# Altium footprint library SparkFun.PCBLIB: 674 footprints (part 31 of 44)
Each footprint in its own frame and in the unit in brackets; x right, y up, seen from the top. Pads: shape width x height; smd on the part's side, far side on the other; paste and mask are expansions set on the pad; w line width, h text height; cw(c..) or ccw(c..) is an arc to the next point about the centre after c.
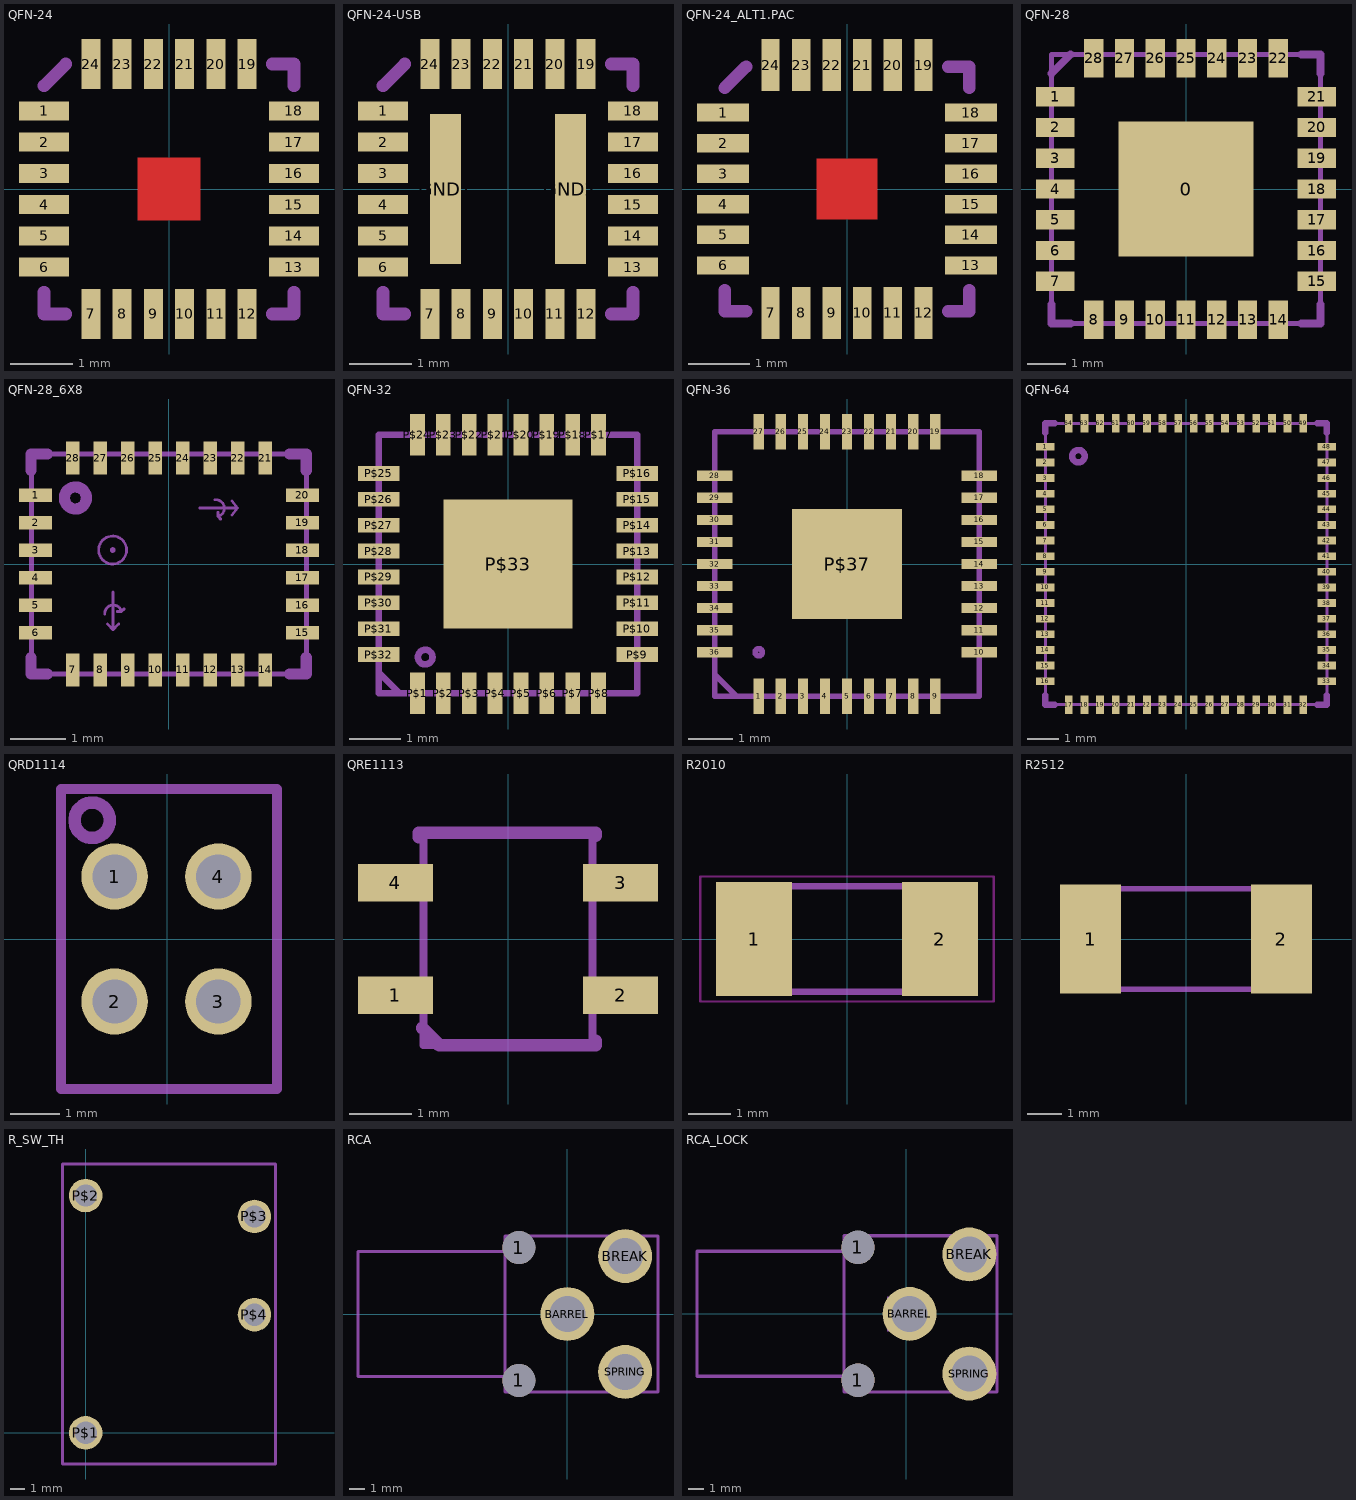
[diagram p30: the footprints below, top view; thin cyan lines are the x and y axes]

## QFN-24 [mil]
pads (24):
  rect 31.5x11.81 smd: 1(-78.74,49.21) 2(-78.74,29.53) 3(-78.74,9.84) 4(-78.74,-9.84) 5(-78.74,-29.53) 6(-78.74,-49.21) 13(78.74,-49.21) 14(78.74,-29.53) 15(78.74,-9.84) 16(78.74,9.84) 17(78.74,29.53) 18(78.74,49.21)
  rect 11.81x31.5 smd: 7(-49.21,-78.74) 8(-29.53,-78.74) 9(-9.84,-78.74) 10(9.84,-78.74) 11(29.53,-78.74) 12(49.21,-78.74) 19(49.21,78.74) 20(29.53,78.74) 21(9.84,78.74) 22(-9.84,78.74) 23(-29.53,78.74) 24(-49.21,78.74)
Top Layer:
  rectangle: -19.69,-19.69 19.69,19.69
Top Paste:
  rectangle: -11.81,-11.81 11.81,11.81
Top Solder:
  rectangle: -19.69,-19.69 19.69,19.69
Mechanical 2:
  lines w8: -78.74,-64.96 -78.74,-78.74 -64.96,-78.74 ; -78.74,64.96 -64.96,78.74 ; 64.96,-78.74 78.74,-78.74 78.74,-64.96 ; 64.96,78.74 78.74,78.74 78.74,64.96

## QFN-24-USB [mm]
pads (26):
  rect 0.8x0.3 smd: 1(-2,1.25) 2(-2,0.75) 3(-2,0.25) 4(-2,-0.25) 5(-2,-0.75) 6(-2,-1.25) 13(2,-1.25) 14(2,-0.75) 15(2,-0.25) 16(2,0.25) 17(2,0.75) 18(2,1.25)
  rect 0.3x0.8 smd: 7(-1.25,-2) 8(-0.75,-2) 9(-0.25,-2) 10(0.25,-2) 11(0.75,-2) 12(1.25,-2) 19(1.25,2) 20(0.75,2) 21(0.25,2) 22(-0.25,2) 23(-0.75,2) 24(-1.25,2)
  rect 0.5x2.4 smd: GND1(-1,0) GND2(1,0)
Mechanical 2:
  lines w0.203: -2,-1.65 -2,-2 -1.65,-2 ; -2,1.65 -1.65,2 ; 1.65,-2 2,-2 2,-1.65 ; 1.65,2 2,2 2,1.65

## QFN-24_ALT1 [mil]

## QFN-24_ALT1.PAC [mil]
pads (24):
  rect 33.5x11.81 smd paste-16.75: 1(-79.74,49.21) 2(-79.74,29.53) 3(-79.74,9.84) 4(-79.74,-9.84) 5(-79.74,-29.53) 6(-79.74,-49.21) 13(79.74,-49.21) 14(79.74,-29.53) 15(79.74,-9.84) 16(79.74,9.84) 17(79.74,29.53) 18(79.74,49.21)
  rect 11.81x33.5 smd paste-16.75: 7(-49.21,-79.74) 8(-29.53,-79.74) 9(-9.84,-79.74) 10(9.84,-79.74) 11(29.53,-79.74) 12(49.21,-79.74) 19(49.21,79.74) 20(29.53,79.74) 21(9.84,79.74) 22(-9.84,79.74) 23(-29.53,79.74) 24(-49.21,79.74)
Top Layer:
  rectangle: -19.69,-19.69 19.69,19.69
Top Paste:
  rectangle: -7,-7 7,7
  rectangle: -96.51,43.33 -66.25,55.15
  rectangle: -96.46,23.64 -66.2,35.46
  rectangle: -96.46,3.94 -66.2,15.76
  rectangle: -96.47,-15.73 -66.21,-3.91
  rectangle: -96.45,-35.46 -66.19,-23.64
  rectangle: -96.51,-55.06 -66.25,-43.24
  region: 96.46,-43.32 66.2,-43.32 66.2,-55.14 96.46,-55.14
  region: 96.41,-23.63 66.15,-23.63 66.15,-35.45 96.41,-35.45
  region: 96.41,-3.93 66.15,-3.93 66.15,-15.75 96.41,-15.75
  region: 96.42,15.74 66.16,15.74 66.16,3.92 96.42,3.92
  region: 96.4,35.47 66.14,35.47 66.14,23.65 96.4,23.65
  region: 96.46,55.07 66.2,55.07 66.2,43.25 96.46,43.25
  region: 43.27,-66.21 43.27,-96.47 55.09,-96.47 55.09,-66.21
  region: 23.58,-66.26 23.58,-96.52 35.4,-96.52 35.4,-66.26
  region: 3.88,-66.26 3.88,-96.52 15.7,-96.52 15.7,-66.26
  region: -15.79,-66.25 -15.79,-96.51 -3.97,-96.51 -3.97,-66.25
  region: -35.52,-66.27 -35.52,-96.53 -23.7,-96.53 -23.7,-66.27
  region: -55.12,-66.21 -55.12,-96.47 -43.3,-96.47 -43.3,-66.21
  region: -43.27,66.21 -43.27,96.47 -55.07,96.47 -55.07,66.21
  region: -23.57,66.26 -23.57,96.52 -35.39,96.52 -35.39,66.26
  region: -3.87,66.26 -3.87,96.52 -15.69,96.52 -15.69,66.26
  region: 15.8,66.24 15.8,96.5 3.98,96.5 3.98,66.24
  region: 35.53,66.26 35.53,96.52 23.71,96.52 23.71,66.26
  region: 55.12,66.21 55.12,96.47 43.32,96.47 43.32,66.21
Top Solder:
  rectangle: -19.69,-19.69 19.69,19.69
Mechanical 2:
  lines w8: -78.74,-64.96 -78.74,-78.74 -64.96,-78.74 ; -78.74,64.96 -64.96,78.74 ; 64.96,-78.74 78.74,-78.74 78.74,-64.96 ; 64.96,78.74 78.74,78.74 78.74,64.96

## QFN-28 [mm]
pads (29):
  rect 3.5x3.5 smd paste-1.75: 0(0,0)
  rect 1x0.5 smd: 1(-3.4,2.4) 2(-3.4,1.6) 3(-3.4,0.8) 4(-3.4,0) 5(-3.4,-0.8) 6(-3.4,-1.6) 7(-3.4,-2.4) 15(3.4,-2.4) 16(3.4,-1.6) 17(3.4,-0.8) 18(3.4,0) 19(3.4,0.8) 20(3.4,1.6) 21(3.4,2.4)
  rect 0.5x1 smd: 8(-2.4,-3.4) 9(-1.6,-3.4) 10(-0.8,-3.4) 11(0,-3.4) 12(0.8,-3.4) 13(1.6,-3.4) 14(2.4,-3.4) 22(2.4,3.4) 23(1.6,3.4) 24(0.8,3.4) 25(0,3.4) 26(-0.8,3.4) 27(-1.6,3.4) 28(-2.4,3.4)
Top Paste:
  rectangle: -0.6,-0.5 0.5,0.6
Mechanical 2:
  lines w0.203: -3.5,-3 -3.5,-3.5 -3,-3.5 ; -3.5,3 -3,3.5 ; 3,-3.5 3.5,-3.5 3.5,-3 ; 3,3.5 3.5,3.5 3.5,3
Mechanical 18:
  lines w0.127: -3.5,-3.5 3.5,-3.5 3.5,3.5 -3.5,3.5 -3.5,-3.5

## QFN-28_6X8 [mil]
pads (28):
  rect 23.62x9.84 smd: 1(-95.16,49.21) 2(-95.16,29.53) 3(-95.16,9.84) 4(-95.16,-9.84) 5(-95.16,-29.53) 6(-95.16,-49.21) 15(95.79,-49.21) 16(95.79,-29.53) 17(95.79,-9.84) 18(95.79,9.84) 19(95.79,29.53) 20(95.79,49.21)
  rect 9.84x23.62 smd: 7(-68.58,-75.79) 8(-48.9,-75.79) 9(-29.21,-75.79) 10(-9.53,-75.79) 11(10.16,-75.79) 12(29.84,-75.79) 13(49.53,-75.79) 14(69.21,-75.79) 21(69.21,75.79) 22(49.53,75.79) 23(29.84,75.79) 24(10.16,75.79) 25(-9.53,75.79) 26(-29.21,75.79) 27(-48.9,75.79) 28(-68.58,75.79)
Mechanical 2:
  circle w8: c-66.61,47.24 r7.87
  lines w8: -98.43,-66.93 -98.43,-78.74 -86.61,-78.74 ; -98.43,66.93 -98.43,78.74 -86.61,78.74 ; 86.61,-78.74 98.43,-78.74 98.43,-66.93 ; 86.61,78.74 98.43,78.74 98.43,66.93
Mechanical 18:
  circle w3.54: c-66.61,47.24 r7.87
  circle w2: c-40,10 r10
  circle w2: c-40,10 r1
  lines w2: -45.69,-36 cw(c-39.61,-35.5) -33.69,-34 ; -43.69,-43 -39.69,-47 ; -39.69,-20 -39.69,-47 ; -36.69,-34 -33.69,-34 ; -35.69,-43 -39.69,-47 ; -31.69,-32 -33.69,-34 ; 22.32,40 49.32,40 ; 33.32,46 cw(c33.82,39.92) 35.32,34 ; 35.32,37 35.32,34 ; 37.32,32 35.32,34 ; 45.32,35 49.32,40 ; 45.32,45 49.32,40
  lines w3.54: -98.11,-78.74 98.74,-78.74 98.74,78.74 -98.11,78.74 -98.11,-78.74

## QFN-32 [mil]
pads (33):
  rect 11.2x31.5 smd: P$1(-68.9,-98.43) P$2(-49.21,-98.43) P$3(-29.53,-98.43) P$4(-9.84,-98.43) P$5(9.84,-98.43) P$6(29.53,-98.43) P$7(49.21,-98.43) P$8(68.9,-98.43) P$17(68.9,98.43) P$18(49.21,98.43) P$19(29.53,98.43) P$20(9.84,98.43) P$21(-9.84,98.43) P$22(-29.53,98.43) P$23(-49.21,98.43) P$24(-68.9,98.43)
  rect 31.5x11.2 smd: P$9(98.43,-68.9) P$10(98.43,-49.21) P$11(98.43,-29.53) P$12(98.43,-9.84) P$13(98.43,9.84) P$14(98.43,29.53) P$15(98.43,49.21) P$16(98.43,68.9) P$25(-98.43,68.9) P$26(-98.43,49.21) P$27(-98.43,29.53) P$28(-98.43,9.84) P$29(-98.43,-9.84) P$30(-98.43,-29.53) P$31(-98.43,-49.21) P$32(-98.43,-68.9)
  rect 98.43x98.43 smd: P$33(0,0)
Mechanical 2:
  circle w5: c-62.99,-70.87 r5.57
  lines w5: -98.43,82.68 -98.43,98.43 -82.68,98.43 ; 82.68,-98.43 98.43,-98.43 98.43,-82.68 ; 82.68,98.43 98.43,98.43 98.43,82.68 ; -98.43,-98.43 -82.68,-98.43 -98.43,-82.68 -98.43,-98.43
Mechanical 18:
  lines w5: -98.43,-98.43 98.43,-98.43 98.43,98.43 -98.43,98.43 -98.43,-98.43

## QFN-36 [mm]
pads (37):
  rect 0.23x0.8 smd: 1(-2,-3) 2(-1.5,-3) 3(-1,-3) 4(-0.5,-3) 5(0,-3) 6(0.5,-3) 7(1,-3) 8(1.5,-3) 9(2,-3) 19(2,3) 20(1.5,3) 21(1,3) 22(0.5,3) 23(0,3) 24(-0.5,3) 25(-1,3) 26(-1.5,3) 27(-2,3)
  rect 0.8x0.23 smd: 10(3,-2) 11(3,-1.5) 12(3,-1) 13(3,-0.5) 14(3,0) 15(3,0.5) 16(3,1) 17(3,1.5) 18(3,2) 28(-3,2) 29(-3,1.5) 30(-3,1) 31(-3,0.5) 32(-3,0) 33(-3,-0.5) 34(-3,-1) 35(-3,-1.5) 36(-3,-2)
  rect 2.5x2.5 smd: P$37(0,0)
Mechanical 2:
  circle w0.127: c-2,-2 r0.081
  lines w0.127: -3,-2.5 -2.5,-3 ; -3,2.5 -3,3 -2.5,3 ; 2.5,-3 3,-3 3,-2.5 ; 2.5,3 3,3 3,2.5
Mechanical 18:
  lines w0.127: -3,-3 -3,3 3,3 3,-3 -3,-3

## QFN-64 [mil]
pads (64):
  rect 23.62x9.84 smd: 1(-177.17,147.64) 2(-177.17,127.95) 3(-177.17,108.27) 4(-177.17,88.58) 5(-177.17,68.9) 6(-177.17,49.21) 7(-177.17,29.53) 8(-177.17,9.84) 9(-177.17,-9.84) 10(-177.17,-29.53) 11(-177.17,-49.21) 12(-177.17,-68.9) 13(-177.17,-88.58) 14(-177.17,-108.27) 15(-177.17,-127.95) 16(-177.17,-147.64) 33(177.17,-147.64) 34(177.17,-127.95) 35(177.17,-108.27) 36(177.17,-88.58) 37(177.17,-68.9) 38(177.17,-49.21) 39(177.17,-29.53) 40(177.17,-9.84) 41(177.17,9.84) 42(177.17,29.53) 43(177.17,49.21) 44(177.17,68.9) 45(177.17,88.58) 46(177.17,108.27) 47(177.17,127.95) 48(177.17,147.64)
  rect 9.84x23.62 smd: 17(-147.64,-177.17) 18(-127.95,-177.17) 19(-108.27,-177.17) 20(-88.58,-177.17) 21(-68.9,-177.17) 22(-49.21,-177.17) 23(-29.53,-177.17) 24(-9.84,-177.17) 25(9.84,-177.17) 26(29.53,-177.17) 27(49.21,-177.17) 28(68.9,-177.17) 29(88.58,-177.17) 30(108.27,-177.17) 31(127.95,-177.17) 32(147.64,-177.17) 49(147.64,177.17) 50(127.95,177.17) 51(108.27,177.17) 52(88.58,177.17) 53(68.9,177.17) 54(49.21,177.17) 55(29.53,177.17) 56(9.84,177.17) 57(-9.84,177.17) 58(-29.53,177.17) 59(-49.21,177.17) 60(-68.9,177.17) 61(-88.58,177.17) 62(-108.27,177.17) 63(-127.95,177.17) 64(-147.64,177.17)
Mechanical 2:
  circle w8: c-135.51,135.83 r7.87
  lines w8: -177.17,-165.35 -177.17,-177.17 -165.35,-177.17 ; -177.17,165.35 -177.17,177.17 -165.35,177.17 ; 165.35,-177.17 177.17,-177.17 177.17,-165.35 ; 165.35,177.17 177.17,177.17 177.17,165.35
Mechanical 18:
  circle w3.54: c-135.51,135.83 r7.87
  lines w3.54: -176.85,-177.17 177.48,-177.17 177.48,177.17 -176.85,177.17 -176.85,-177.17

## QRD1114 [mil]
pads (4):
  round 53.15 hole 35.43: 1(-42,50) 2(-42,-50) 3(41,-50) 4(41,50)
Mechanical 2:
  circle w10: c-60,95 r14.14
  lines w8: -85,-120 -85,120 88,120 88,-120 -85,-120

## QRE1113 [mil]
pads (4):
  rect 47.24x23.62 smd: 1(-70.87,-35.43) 2(70.87,-35.43) 3(70.87,35.43) 4(-70.87,35.43)
Mechanical 2:
  lines w8: -56.18,64.06 -56.18,66.93 55.12,66.93 55.12,65.12 ; -53.94,-56.06 -43.31,-66.93 55.12,-66.93 55.12,-64.06
Mechanical 18:
  lines w5: -53.15,-66.93 -53.15,66.93 53.15,66.93 53.15,-66.93 -53.15,-66.93

## R2010 [mil]
pads (2):
  rect 70.87x106.3 smd: 1(-86.61,0) 2(86.61,0)
Keep-Out Layer:
  lines w2: -136.73,-58.39 136.73,-58.39 136.73,58.39 -136.73,58.39 -136.73,-58.39
Mechanical 2:
  lines w6: -40.43,49.02 40.43,49.02 ; -39.45,-49.02 40,-49.02
Mechanical 18:
  rectangle: -98,-52 -64.54,52.33
  rectangle: 65,-52 98.46,52.33
  lines w6: -65.43,49.02 65.43,49.02 ; -64.45,-49.02 66.42,-49.02

## R2512 [mil]
pads (2):
  rect 70.87x125.98 smd: 1(-110.24,0) 2(110.24,0)
Mechanical 18:
  rectangle: -126,-61 -92.54,61.05
  rectangle: 93,-61 126.46,61.05
  lines w6: -92.99,-57.99 93.98,-57.99 ; -92.99,57.99 93.98,57.99

## R_SW_TH [mil]
pads (4):
  round 94.5 hole 63: P$1(0,0) P$2(0,669) P$3(476,610) P$4(476,333)
Mechanical 2:
  lines w8: -65,-88 -65,-54 -65,758 535,758 535,-88 -65,-88

## RCA [mm]
pads (5):
  round 2.1 hole 2.1: 1(-3.1,-4.25) 1(-3.1,4.25)
  round 3.45 hole 2.3: BARREL(0,0) BREAK(3.7,3.7) SPRING(3.7,-3.7)
Mechanical 2:
  lines w0.203: -4,-3 -4,3 ; -2,-5 2,-5 ; -2,5 2,5 ; 5.8,-5 5.8,5
Mechanical 18:
  lines w0.203: -4,-4 -13.4,-4 -13.4,4 -4,4 ; -4,-5 -4,5 5.8,5 5.8,-5 -4,-5

## RCA_LOCK [mil]
pads (5):
  round 84 hole 84: 1(-122.05,-167.32) 1(-122.05,167.32)
  round 135.82 hole 90.55: BARREL(8,0) BREAK(158.67,149.67) SPRING(158.67,-150.67)
Mechanical 2:
  lines w8: -157.48,-118.11 -157.48,118.11 ; -78.74,-196.85 78.74,-196.85 ; -78.74,196.85 78.74,196.85 ; 228.35,-196.85 228.35,196.85
Mechanical 18:
  rectangle: -152,137 -93,196
  rectangle: -152,-198 -93,-139
  rectangle: -49,-44 10,44
  rectangle: 113,-153 201,-139
  rectangle: 113,137 201,151
  lines w1: 113,-138 176,-138 ; 113,136 176,136
  lines w8: -157.48,-157.48 -527.56,-157.48 -527.56,157.48 -157.48,157.48 ; -157.48,-196.85 -157.48,196.85 228.35,196.85 228.35,-196.85 -157.48,-196.85